# Altium footprint library PASSIVE_SMD.PCBLIB: 213 footprints (part 14 of 14)
Each footprint in its own frame and in the unit in brackets; x right, y up, seen from the top. Pads: shape width x height; smd on the part's side, far side on the other; paste and mask are expansions set on the pad; w line width, h text height; cw(c..) or ccw(c..) is an arc to the next point about the centre after c.
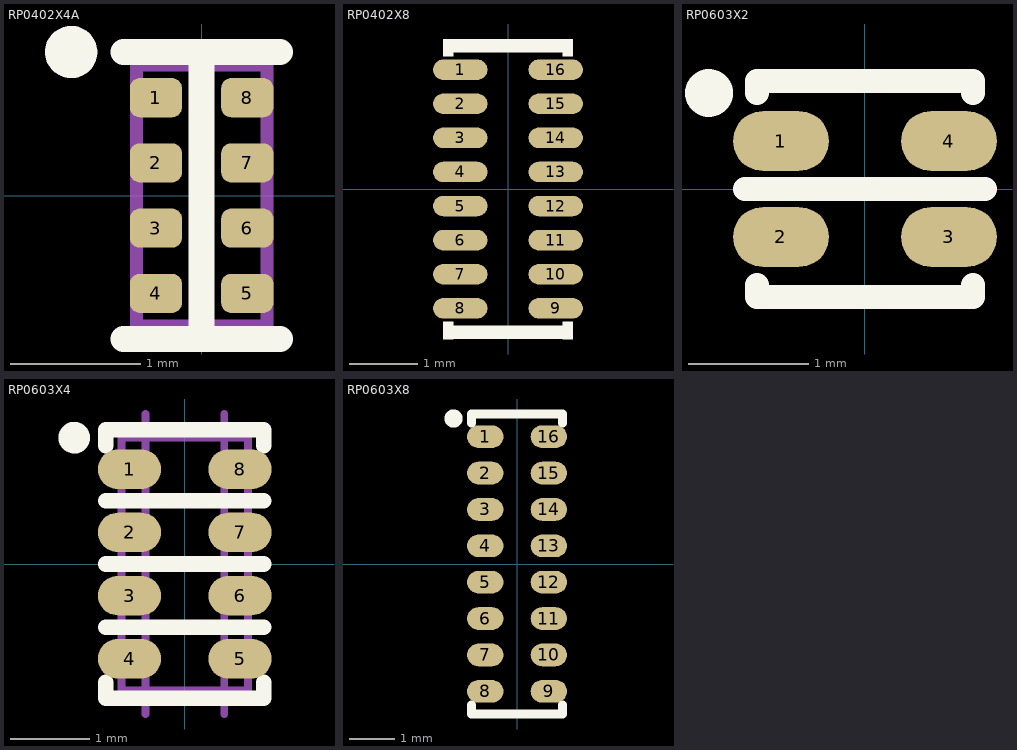
[diagram p13: the footprints below, top view; thin cyan lines are the x and y axes]

## RP0402X4A [mm] "RPACK, 0804, 0402X4, 100X50X4, 2.00x1.00mm"
height 0.4
pads (8):
  rrect50% 0.4x0.3 smd paste-0.05 mask+0.05: 1(-0.35,0.75) 2(-0.35,0.25) 3(-0.35,-0.25) 4(-0.35,-0.75) 5(0.35,-0.75) 6(0.35,-0.25) 7(0.35,0.25) 8(0.35,0.75)
Top Overlay:
  circle w0.2: c-1,1.1 r0.1
  lines w0.2: -0.6,-1.1 0.6,-1.1 ; -0.6,1.1 0.6,1.1 ; 0,-1.1 0,1.1
Mechanical 13:
  lines w0.1: -0.5,-1 0.5,-1 0.5,1 -0.5,1 -0.5,-1
3D body "User Library-YC124-1.step": height 0.45, standoff 0, extent -0.5,-1 0.5,1

## RP0402X8 [mm] "RPACK, 0402X8, 4x1.6mm"
height 0.4
pads (16):
  oval 0.8x0.3 smd paste-0.05 mask+0.05: 1(-0.7,1.75) 2(-0.7,1.25) 3(-0.7,0.75) 4(-0.7,0.25) 5(-0.7,-0.25) 6(-0.7,-0.75) 7(-0.7,-1.25) 8(-0.7,-1.75) 9(0.7,-1.75) 10(0.7,-1.25) 11(0.7,-0.75) 12(0.7,-0.25) 13(0.7,0.25) 14(0.7,0.75) 15(0.7,1.25) 16(0.7,1.75)
Top Overlay:
  region: -0.8,-2.2 -0.8,-1.95 -0.95,-1.95 -0.95,-2.2
  region: 0.8,-2.2 0.8,-1.95 0.95,-1.95 0.95,-2.2
  region: 0.8,2.2 0.8,1.95 0.95,1.95 0.95,2.2
  region: -0.8,2.2 -0.8,1.95 -0.95,1.95 -0.95,2.2
  lines w0.2: -0.85,-2.1 0.85,-2.1 ; -0.85,2.1 0.85,2.1
3D body "User Library-YC248-1.step": height 0.45, standoff 0, extent -0.8,-2 0.8,2

## RP0603X2 [mm] "RPACK, 0603X2, 742C043, EXBV4V"
height 0.4
pads (4):
  oval 0.8x0.5 smd paste-0.05 mask+0.075: 1(-0.7,0.4) 2(-0.7,-0.4) 3(0.7,-0.4) 4(0.7,0.4)
Top Overlay:
  circle w0.2: c-1.3,0.8 r0.1
  lines w0.2: -1,0 1,0 ; -0.9,-0.8 -0.9,-0.9 0.9,-0.9 0.9,-0.8 ; -0.9,0.8 -0.9,0.9 0.9,0.9 0.9,0.8
3D body "User Library-EXBV4V.step": height 0.53, standoff -0.03, extent -0.8,-0.8 0.8,0.8

## RP0603X4 [mm] "RPACK, 0603X4, 160X80X4 1206, 742C083, EXBV8V"
height 0.4
pads (8):
  oval 0.8x0.5 smd paste-0.05 mask+0.075: 1(-0.7,1.2) 2(-0.7,0.4) 3(-0.7,-0.4) 4(-0.7,-1.2) 5(0.7,-1.2) 6(0.7,-0.4) 7(0.7,0.4) 8(0.7,1.2)
Top Overlay:
  circle w0.2: c-1.4,1.6 r0.1
  lines w0.2: -1,-1.5 -1,-1.7 1,-1.7 1,-1.5 ; -1,-0.8 1,-0.8 ; -1,0 1,0 ; -1,0.8 1,0.8 ; -1,1.5 -1,1.7 1,1.7 1,1.5
Mechanical 13:
  lines w0.1: -0.5,-1.9 -0.5,1.9 ; 0.5,-1.9 0.5,1.9 ; -0.8,-1.6 0.8,-1.6 0.8,1.6 -0.8,1.6 -0.8,-1.6
  text "0603X4" at -1.3,-2.6 h0.5
  text "4X0402" at -1.3,2.1 h0.5
3D body "User Library-Array-1206-4Way-Var1.STEP": height 0.5, standoff 0, extent -0.8,-1.6 0.8,1.6

## RP0603X8 [mm] "RPACK, 0603X8, 742C163, EXB2HV"
height 0.4
pads (16):
  oval 0.8x0.5 smd paste-0.05 mask+0.075: 1(-0.7,2.8) 2(-0.7,2) 3(-0.7,1.2) 4(-0.7,0.4) 5(-0.7,-0.4) 6(-0.7,-1.2) 7(-0.7,-2) 8(-0.7,-2.8) 9(0.7,-2.8) 10(0.7,-2) 11(0.7,-1.2) 12(0.7,-0.4) 13(0.7,0.4) 14(0.7,1.2) 15(0.7,2) 16(0.7,2.8)
Top Overlay:
  circle w0.2: c-1.4,3.2 r0.1
  lines w0.2: -1,-3.1 -1,-3.3 1,-3.3 1,-3.1 ; -1,3.1 -1,3.3 1,3.3 1,3.1
3D body "User Library-742C163.step": height 0.53, standoff -0.03, extent -0.8,-3.2 0.8,3.2